# Altium footprint library Minh_Lib.PcbLib: 141 footprints (part 9 of 9)
Each footprint in its own frame and in the unit in brackets; x right, y up, seen from the top. Pads: shape width x height; smd on the part's side, far side on the other; paste and mask are expansions set on the pad; w line width, h text height; cw(c..) or ccw(c..) is an arc to the next point about the centre after c.
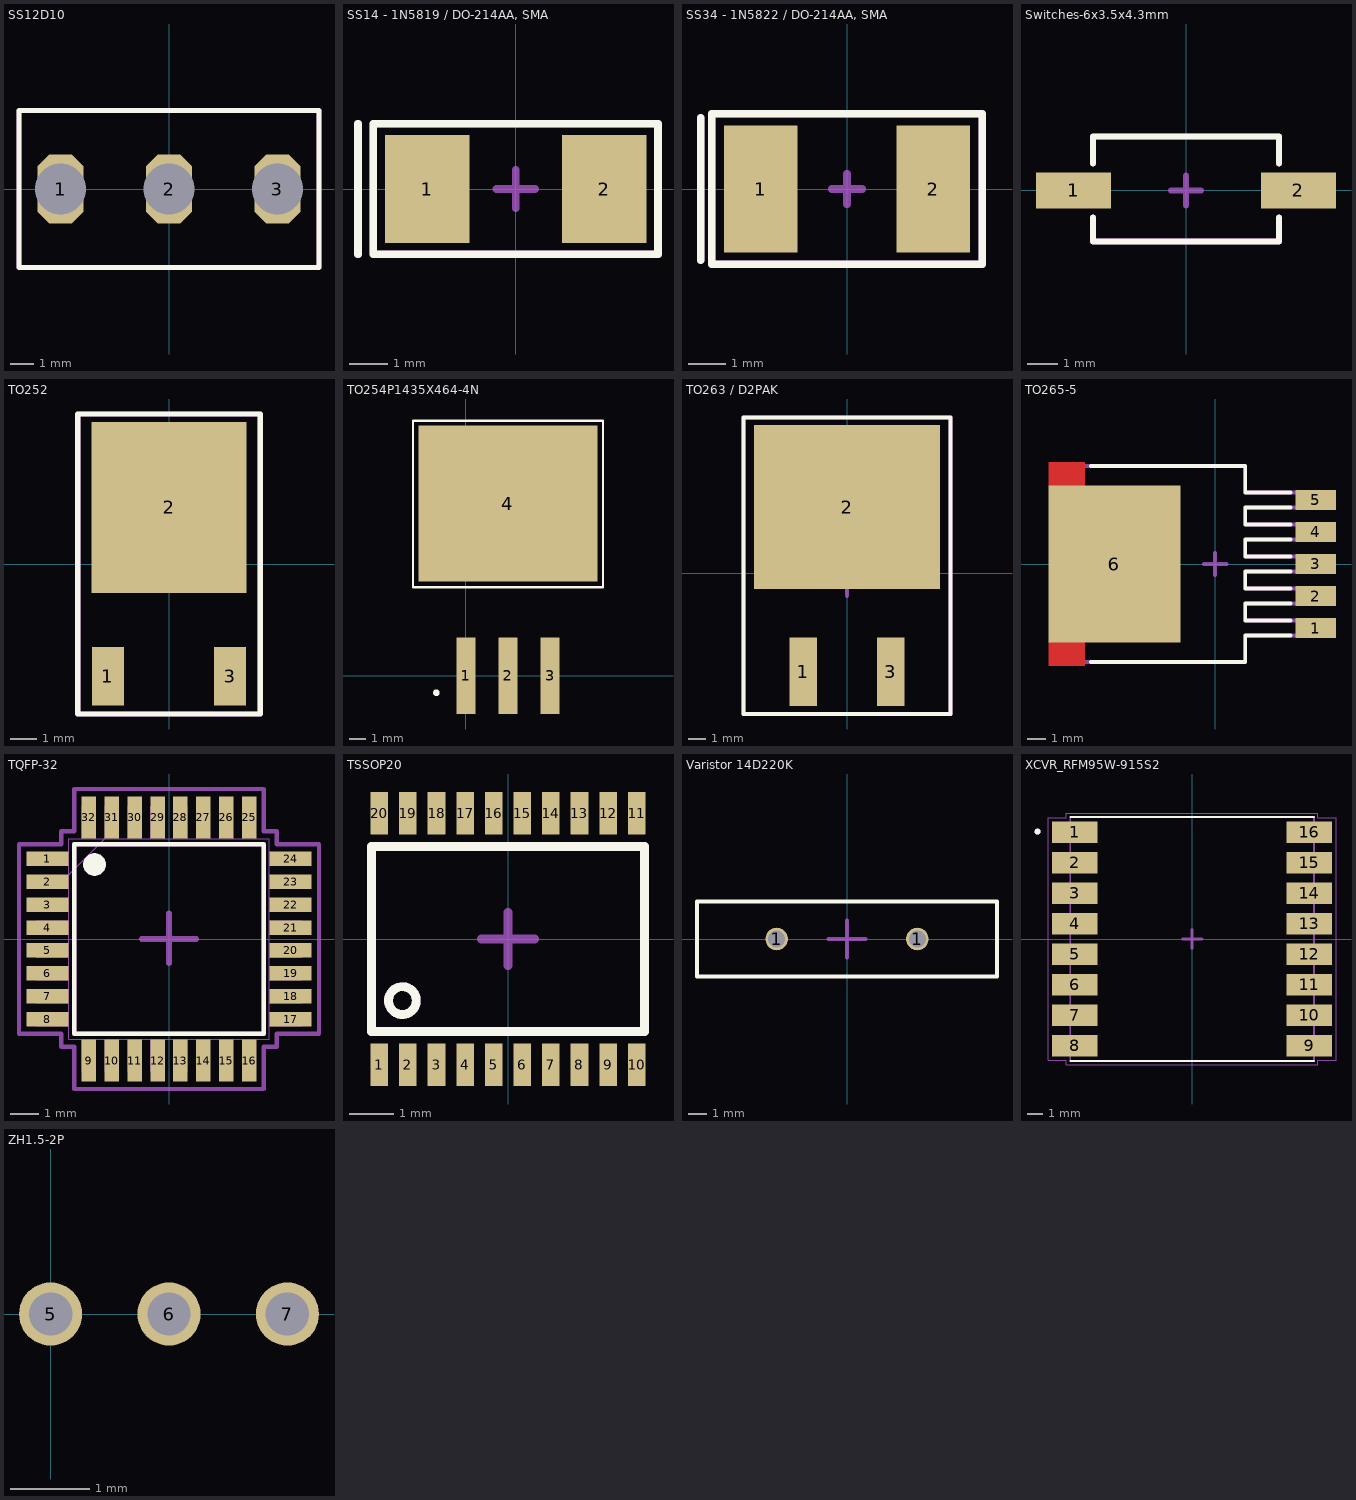
[diagram p8: the footprints below, top view; thin cyan lines are the x and y axes]

## SS12D10 [mm]
pads (3):
  oct 2x3 hole 2.2 square: 1(-4.7,0) 2(0,0) 3(4.7,0)
Top Overlay:
  lines w0.2: -6.5,-3.4 6.5,-3.4 6.5,3.4 -6.5,3.4 -6.5,-3.4
Mechanical 13:
  lines w0.2: -6.5,-3.4 6.5,-3.4 6.5,3.4 -6.5,3.4 -6.5,-3.4
  text "'.Designator'" at -6,-2.733 h0.8
Mechanical 15:
  lines w0.2: -0.7,0 0,0 ; 0,-0.7 0,0 ; 0,0.7 0,0 ; 0.7,0 0,0
3D body "ss-12d10l6 colour.STEP": height 12.4, standoff -6.9, extent -6.5,-3.4 6.5,3.4

## SS14 - 1N5819 / DO-214AA, SMA [mm] "DIODE - SMA"
pads (2):
  rect 2.2x2.8 smd: 1(-2.3,0) 2(2.3,0)
Top Overlay:
  lines w0.2: -4.1,-1.7 -4.1,1.7 ; -3.7,-1.7 -3.7,1.7 3.7,1.7 3.7,-1.7 -3.7,-1.7
Mechanical 13:
  lines w0.2: -4.1,-1.7 -4.1,1.7 ; -3.7,-1.7 -3.7,1.7 3.7,1.7 3.7,-1.7 -3.7,-1.7
  text "'.Designator'" at -3.6,-1.267 h1
Mechanical 15:
  lines w0.2: -0.5,0 0,0 ; 0,-0.5 0,0 ; 0,0.5 0,0 ; 0.5,0 0,0
3D body "User Library-DO-214AC SMA.step": height 2.4, standoff 0, extent -2.6,-1.3 2.6,1.3

## SS34 - 1N5822 / DO-214AA, SMA [mm] "Diode SMA"
pads (2):
  rect 1.96x3.39 smd: 1(-2.3,0) 2(2.3,0)
Top Overlay:
  lines w0.2: -3.9,-1.9 -3.9,1.9 ; -3.6,-2 3.6,-2 3.6,2 -3.3,2 -3.6,2 -3.6,-2
Mechanical 13:
  lines w0.2: -3.9,-1.9 -3.9,1.9 ; -3.6,-2 3.6,-2 3.6,2 -3.3,2 -3.6,2 -3.6,-2
  text "'.Designator'" at -3.2,-1.267 h1
Mechanical 15:
  lines w0.2: -0.4,0 0,0 ; 0,-0.4 0,0 ; 0,0.4 0,0 ; 0.4,0 0,0
3D body "SS34-DO-214AC.step": height 1.95, standoff 0, extent -2.55,-1.35 2.55,1.35

## Switches-6x3.5x4.3mm [mm]
pads (2):
  rect 2.5x1.2 smd: 1(-3.75,0) 2(3.75,0)
Top Overlay:
  lines w0.2: -3.1,-0.9 -3.1,-1.7 3.1,-1.7 3.1,-0.9 ; -3.1,0.9 -3.1,1.8 3.1,1.8 3.1,0.9
Mechanical 13:
  lines w0.2: -3.1,-0.9 -3.1,-1.7 3.1,-1.7 3.1,-0.9 ; -3.1,0.9 -3.1,1.8 3.1,1.8 3.1,0.9
  text "'.Designator'" at -3.9,-0.333 h0.8
Mechanical 15:
  lines w0.2: -0.5,0 0,0 ; 0,-0.5 0,0 ; 0,0.5 0,0 ; 0.5,0 0,0
3D body "Tactile_Switch_SMD.step": height 4.3, standoff 0, extent -4,-1.7 4,1.8

## TO252 [mm]
pads (4):
  rect 1.2x2.2 smd: 1(-2.28,-4.19) 3(2.28,-4.19) ""(2.28,-4.19)
  rect 5.8x6.4 smd: 2(0,2.11)
Top Overlay:
  lines w0.2: -3.4,-5.6 3.4,-5.6 3.4,5.6 -3.4,5.6 -3.4,-5.6
Mechanical 13:
  lines w0.2: -3.4,-5.6 3.4,-5.6 3.4,5.6 -3.4,5.6 -3.4,-5.6
  text "'.Designator'" at -3,-0.333 h0.8
Mechanical 15:
  lines w0.254: -0.6,0 0,0 ; 0,-0.6 0,0 ; 0,0.6 0,0 ; 0.6,0 0,0
3D body "7805 TO252.STEP": height 2.41, standoff -0.02, extent -3.25,-4.7 3.25,4.993

## TO254P1435X464-4N [mm]
pads (4):
  rect 1.15x4.6 smd: 1(0,0) 2(2.54,0) 3(5.08,0)
  rect 10.8x9.4 smd: 4(2.54,10.375)
Top Overlay:
  circle w0.2: c-1.778,-1.016 r0.1
  lines w0.127: -3.173,5.334 8.255,5.334 8.255,15.367 -3.173,15.367 -3.173,5.334
3D body "DDPAK-TO-263-3.step": height 4.44, standoff 0, extent -2.54,-2.159 7.62,14.491

## TO263 / D2PAK [mm] "D2PAK"
pads (3):
  rect 1.6x4 smd: 1(-2.54,-5.713) 3(2.54,-5.713)
  rect 10.8x9.5 smd: 2(0,3.837)
Top Overlay:
  lines w0.254: -6,-8.163 6,-8.163 6,9.038 -6,9.038 -6,-8.163
Mechanical 13:
  lines w0.254: -6,-8.163 6,-8.163 6,9.038 -6,9.038 -6,-8.163
  text "'.Designator'" at -5.4,-0.2 h1.2
Mechanical 15:
  lines w0.254: -1.3,0 0,0 ; 0,-1.3 0,0 ; 0,1.3 0,0 ; 1.3,0 0,0
3D body "to263-3_p5-08_l10-414_w4-826.stp": height 4.83, standoff -0.01, extent -5.207,-7.515 5.207,8.284

## TO265-5 [mm]
pads (6):
  rect 2.16x1.07 smd paste-0.102 mask+0.051: 1(5.338,-3.4) 2(5.338,-1.7) 3(5.338,0.005) 4(5.338,1.7) 5(5.338,3.4)
  rect 6.99x8.33 smd paste-0.102 mask+0.051: 6(-5.338,0)
Top Layer:
  region: -8.832,-4.131 -8.832,-5.4 -6.923,-5.4 -6.923,-4.131
  region: -8.832,5.4 -8.832,4.146 -6.923,4.146 -6.923,5.4
Top Overlay:
  lines w0.2: -6.6,-5.2 1.6,-5.2 1.6,-3.8 4,-3.8 ; -6.6,5.2 1.6,5.2 1.6,3.8 4,3.8 ; 4,-3 1.6,-3 1.6,-2.1 4,-2.1 ; 4,-1.3 1.6,-1.3 1.6,-0.4 4,-0.4 ; 4,0.4 1.6,0.4 1.6,1.3 4,1.3 ; 4,2.1 1.6,2.1 1.6,3 4,3
Top Paste:
  region: -8.731,-4.002 -8.731,-5.298 -7.024,-5.298 -7.024,-4.002
  region: -8.731,5.298 -8.731,4.102 -7.024,4.102 -7.024,5.298
Top Solder:
  region: -8.883,-3.849 -8.883,-5.451 -6.872,-5.451 -6.872,-3.849
  region: -8.883,5.451 -8.883,3.949 -6.872,3.949 -6.872,5.451
Mechanical 13:
  lines w0.2: -8.3,-3.3 -7.9,-5.2 1.6,-5.2 1.6,-3.8 6,-3.8 6,-3 1.6,-3 1.6,-2.1 6,-2.1 6,-1.3 1.6,-1.3 1.6,-0.4 6,-0.4 6,0.4 1.6,0.4 1.6,1.3 6,1.3 6,2.1 1.6,2.1 1.6,3 6,3 6,3.8 1.6,3.8 1.6,5.2 -7.9,5.2 -8.3,3.6 -8.3,-3.3
  text ".Designator" at -7.7,-0.5 h1.27
Mechanical 15:
  lines w0.2: -0.6,0 0,0 ; 0,-0.6 0,0 ; 0,0.6 0,0 ; 0.6,0 0,0
3D body: height 0.25, standoff 0, extent 0,0 0.254,0.254
3D body "User Library-TO-263-5.STEP": height 4.57, standoff 0.01, extent -8.207,-5.1 5.807,5.06

## TQFP-32 [mil]
pads (34):
  rect 58x20 smd paste+0 mask+0: 1(-167,110.24) 2(-167,78.74) 3(-167,47.24) 4(-167,15.75) 5(-167,-15.75) 6(-167,-47.24) 7(-167,-78.74) 8(-167,-110.24) 17(167,-110.24) 18(167,-78.74) 19(167,-47.24) 20(167,-15.75) 21(167,15.75) 22(167,47.24) 23(167,78.74) 24(167,110.24)
  rect 20x58 smd paste+0 mask+0: 9(-110.24,-167) 10(-78.74,-167) 11(-47.24,-167) 12(-15.75,-167) 13(15.75,-167) 14(47.24,-167) 15(78.74,-167) 16(110.24,-167) 25(110.24,167) 26(78.74,167) 27(47.24,167) 28(15.75,167) 29(-15.75,167) 30(-47.24,167) 31(-78.74,167) 32(-110.24,167)
  round 31.5 on Top Overlay: ""(-102.36,102.36)
  round 31.5 on Mech13: ""(-102.36,102.36)
Top Overlay:
  lines w5.91: -129.92,-129.92 129.92,-129.92 129.92,129.92 -129.92,129.92 -129.92,-129.92
Mechanical 13:
  lines w1: -138,88 -88,138 ; -182,-119.24 -182,-101.24 -138,-101.24 -138,-119.24 -182,-119.24 ; -182,-87.74 -182,-69.74 -138,-69.74 -138,-87.74 -182,-87.74 ; -182,-56.24 -182,-38.24 -138,-38.24 -138,-56.24 -182,-56.24 ; -182,-24.75 -182,-6.75 -138,-6.75 -138,-24.75 -182,-24.75 ; -182,6.75 -182,24.75 -138,24.75 -138,6.75 -182,6.75 ; -182,38.24 -182,56.24 -138,56.24 -138,38.24 -182,38.24 ; -182,69.74 -182,87.74 -138,87.74 -138,69.74 -182,69.74 ; -182,101.24 -182,119.24 -138,119.24 -138,101.24 -182,101.24 ; -138,-138 138,-138 138,138 -138,138 -138,-138 ; -119.24,-182 -119.24,-138 -101.24,-138 -101.24,-182 -119.24,-182 ; -119.24,138 -101.24,138 -101.24,182 -119.24,182 -119.24,138 ; -87.74,-182 -87.74,-138 -69.74,-138 -69.74,-182 -87.74,-182 ; -87.74,138 -69.74,138 -69.74,182 -87.74,182 -87.74,138 ; -56.24,-182 -56.24,-138 -38.24,-138 -38.24,-182 -56.24,-182 ; -56.24,138 -38.24,138 -38.24,182 -56.24,182 -56.24,138 ; -24.75,-182 -24.75,-138 -6.75,-138 -6.75,-182 -24.75,-182 ; -24.75,138 -6.75,138 -6.75,182 -24.75,182 -24.75,138 ; 6.75,-182 6.75,-138 24.75,-138 24.75,-182 6.75,-182 ; 6.75,138 24.75,138 24.75,182 6.75,182 6.75,138 ; 38.24,-182 38.24,-138 56.24,-138 56.24,-182 38.24,-182 ; 38.24,138 56.24,138 56.24,182 38.24,182 38.24,138 ; 69.74,-182 69.74,-138 87.74,-138 87.74,-182 69.74,-182 ; 69.74,138 87.74,138 87.74,182 69.74,182 69.74,138 ; 101.24,-182 101.24,-138 119.24,-138 119.24,-182 101.24,-182 ; 101.24,138 119.24,138 119.24,182 101.24,182 101.24,138 ; 138,-119.24 138,-101.24 182,-101.24 182,-119.24 138,-119.24 ; 138,-87.74 138,-69.74 182,-69.74 182,-87.74 138,-87.74 ; 138,-56.24 138,-38.24 182,-38.24 182,-56.24 138,-56.24 ; 138,-24.75 138,-6.75 182,-6.75 182,-24.75 138,-24.75 ; 138,6.75 138,24.75 182,24.75 182,6.75 138,6.75 ; 138,38.24 138,56.24 182,56.24 182,38.24 138,38.24 ; 138,69.74 138,87.74 182,87.74 182,69.74 138,69.74 ; 138,101.24 138,119.24 182,119.24 182,101.24 138,101.24
  lines w5.91: -129.92,-129.92 129.92,-129.92 129.92,129.92 -129.92,129.92 -129.92,-129.92
  text "'.Designator'" at -122.05,-1.31 h19.68
Mechanical 15:
  lines w6: -206,-130.24 -148,-130.24 -148,-148 -130.24,-148 -130.24,-206 130.24,-206 130.24,-148 148,-148 148,-130.24 206,-130.24 206,130.24 148,130.24 148,148 130.24,148 130.24,206 -130.24,206 -130.24,148 -148,148 -148,130.24 -206,130.24 -206,-130.24
  lines w7.87: -37.4,0 -1.97,0 ; 0,-33.46 0,1.97 ; 0,0 0,35.43 ; 1.97,0 37.4,0
3D body "32A_ATM.step": height 47.09, standoff 0, extent -182,-182 182.01,182.01

## TSSOP20 [mm]
pads (20):
  rect 0.4x0.97 smd: 1(-2.925,-2.86) 2(-2.275,-2.86) 3(-1.625,-2.86) 4(-0.975,-2.86) 5(-0.325,-2.86) 6(0.325,-2.86) 7(0.975,-2.86) 8(1.625,-2.86) 9(2.275,-2.86) 10(2.925,-2.86) 11(2.925,2.86) 12(2.275,2.86) 13(1.625,2.86) 14(0.975,2.86) 15(0.325,2.86) 16(-0.325,2.86) 17(-0.975,2.86) 18(-1.625,2.86) 19(-2.275,2.86) 20(-2.925,2.86)
Top Overlay:
  circle w0.2: c-2.4,-1.4 r0.316
  lines w0.2: -3.1,-2.1 3.1,-2.1 3.1,2.1 -3.1,2.1 -3.1,-2.1
Mechanical 13:
  circle w0.2: c-2.4,-1.4 r0.316
  lines w0.2: -3.1,-2.1 3.1,-2.1 3.1,2.1 -3.1,2.1 -3.1,-2.1
Mechanical 15:
  lines w0.2: -0.6,0 0,0 ; 0,-0.6 0,0 ; 0,0.6 0,0 ; 0.6,0 0,0
3D body "STM8S003F3P6.step": height 1.1, standoff 0, extent -3.25,-3.2 3.25,3.2

## Varistor 14D220K [mm] "22V"
pads (2):
  round 1.2 hole 0.9: 1(-3.75,0) 1(3.75,0)
Top Overlay:
  lines w0.2: -8,-2 -8,2 8,2 8,-2 -8,-2
Mechanical 15:
  lines w0.2: -1,0 0,0 ; 0,-1 0,0 ; 0,1 0,0 ; 1,0 0,0
3D body "70231724.stp": height 22.25, standoff -17.75, extent -8.15,-2.2 8.35,2

## XCVR_RFM95W-915S2 [mm]
pads (16):
  rect 3x1.4 smd: 1(-7.7,7) 2(-7.7,5) 3(-7.7,3) 4(-7.7,1) 5(-7.7,-1) 6(-7.7,-3) 7(-7.7,-5) 8(-7.7,-7) 9(7.7,-7) 10(7.7,-5) 11(7.7,-3) 12(7.7,-1) 13(7.7,1) 14(7.7,3) 15(7.7,5) 16(7.7,7)
Top Overlay:
  circle w0.2: c-10.15,7.05 r0.1
  lines w0.127: -8,-8 8,-8 ; -8,8 8,8
Mechanical 13:
  circle w0.2: c-10.15,7.05 r0.1
  lines w0.127: -8,-8 8,-8 8,8 -8,8 -8,-8
Mechanical 15:
  lines w0.05: -9.45,-7.95 -9.45,7.95 -8.25,7.95 -8.25,8.25 8.25,8.25 8.25,7.95 9.45,7.95 9.45,-7.95 8.25,-7.95 8.25,-8.25 -8.25,-8.25 -8.25,-7.95 -9.45,-7.95
  lines w0.2: -0.635,0 0,0 ; 0,-0.635 0,0 ; 0,0.635 0,0 ; 0.635,0 0,0
3D body "RFM95 LoRa v15.step": height 2.04, standoff 0, extent -8,-8 8,8

## ZH1.5-2P [mm]
pads (3):
  round 0.8 hole 0.55: 5(0,0) 6(1.5,0) 7(3,0)